# Altium schematic symbol library Minh_Lib.SchLib: 619 symbols (part 2 of 4)
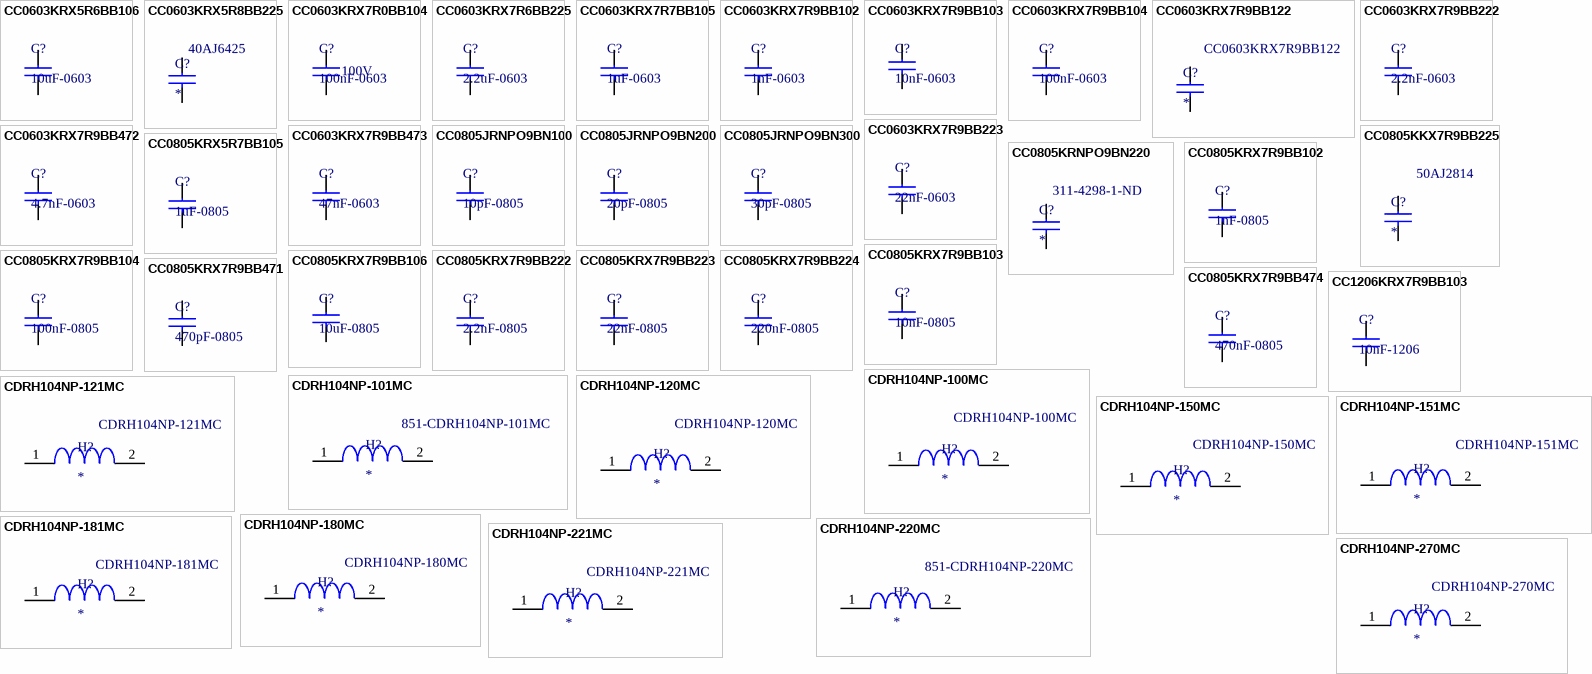
[diagram p16: symbols CC0603KRX5R6BB106 to CDRH104NP-270MC]

## CC0603KRX7R9BB222
designator C?, comment 2.2nF-0603
Multilayer Ceramic Capacitors MLCC - SMD/SMT 2200PF 50V 10% 0603; Manufacturer: Yageo; Manufacturer Part Number: CC0603KRX7R9BB222; Type: General Purpose and High Capacitance Surface Mount Ceramic Multilayer Capacitor; Voltage Rating DC: 50 VDC; Capacitance - nF: 2.2 nF; Capacitance - uF: 0.0022 uF; Class: Class 2; Dielectric: X7R; Value: 2.2nF; Supplier 1: Mouser; RoHS: RoHS Compliant; Category: Multilayer Ceramic Capacitors MLCC - SMD/SMT; Stock 1: 167669; Pricing 1: 1=0.100, 10=0.090, 100=0.070, 1000=0.065, 4000=0.010, 8000=0.009 (USD); Capacitance: 2200 pF; Height: 0.8 mm; Length: 1.6 mm; Package / Case: 0603 (1608 metric); Packaging: Cut Tape; Product: General Type MLCCs; Series: CC; Termination Style: SMD/SMT; Tolerance: 10 %; Brand: Yageo; Case Code - in: 0603; Case Code - mm: 1608; Maximum Operating Temperature: + 125 C; Minimum Operating Temperature: - 55 C; Product Type: Ceramic Capacitors; Standard Pack Qty: 4000; Subcategory: Capacitors; Termination: Standard; RoHS - Mouser: Y; Minimum Order Quantity: 1; Reeling: True; ComponentLink1URL: https://www.mouser.com/datasheet/2/447/UPY-GPHC_X7R_6.3V-to-50V_18-1154002.pdf; ComponentLink1Description: https://www.mouser.com/datasheet/2/447/UPY-GPHC_X7R_6.3V-to-50V_18-1154002.pdf; Supplier Part Number 1: 603-C0603KRX7R9BB222; Width: 0.8 mm
footprint CAP0603 (Capacitor SMD 0603 ( imperal ))
pins: 1, 2

## CC0603KRX7R9BB223
designator C?, comment 22nF-0603
Multilayer Ceramic Capacitors MLCC - SMD/SMT 22nF 50V X7R 10%; Manufacturer: Yageo; Manufacturer Part Number: CC0603KRX7R9BB223; Capacitance: 0.022 uF; Type: General Purpose and High Capacitance Surface Mount Ceramic Multilayer Capacitor; Voltage Rating DC: 50 VDC; Capacitance - pF: 22000 pF; Class: Class 2; Supplier 1: Mouser; RoHS: RoHS Compliant; Category: Multilayer Ceramic Capacitors MLCC - SMD/SMT; Stock 1: 23033; Pricing 1: 1=0.100, 10=0.064, 100=0.020, 1000=0.015, 4000=0.011, 8000=0.010, 24000=0.009 (USD); Height: 0.8 mm; Length: 1.6 mm; Package / Case: 0603 (1608 metric); Packaging: Cut Tape; Product: General Type MLCCs; Series: CC; Termination Style: SMD/SMT; Tolerance: 10 %; Width: 0.8 mm; Brand: Yageo; Capacitance - nF: 22 nF; Case Code - in: 0603; Case Code - mm: 1608; Dielectric: X7R; Maximum Operating Temperature: + 125 C; Minimum Operating Temperature: - 55 C; Product Type: Ceramic Capacitors; Standard Pack Qty: 4000; Subcategory: Capacitors; Termination: Standard; RoHS - Mouser: Y; Minimum Order Quantity: 1; Reeling: True; ComponentLink1URL: https://www.mouser.com/datasheet/2/447/UPY-GPHC_X7R_6.3V-to-50V_18-1154002.pdf; ComponentLink1Description: https://www.mouser.com/datasheet/2/447/UPY-GPHC_X7R_6.3V-to-50V_18-1154002.pdf; Supplier Part Number 1: 603-CC603KRX7R9BB223; Value: 22nF
footprint CAP0603 (Capacitor SMD 0603 ( imperal ))
pins: 1, 2

## CC0603KRX7R9BB472
designator C?, comment 4.7nF-0603
Multilayer Ceramic Capacitors MLCC - SMD/SMT 4700PF 50V 10% 0603; Manufacturer: Yageo; Manufacturer Part Number: CC0603KRX7R9BB472; Type: General Purpose and High Capacitance Surface Mount Ceramic Multilayer Capacitor; Voltage Rating DC: 50 VDC; Capacitance - nF: 4.7 nF; Capacitance - uF: 0.0047 uF; Class: Class 2; Dielectric: X7R; Value: 4.7nF; Supplier 1: Mouser; RoHS: RoHS Compliant; Category: Multilayer Ceramic Capacitors MLCC - SMD/SMT; Stock 1: 246315; Pricing 1: 1=0.100, 10=0.027, 100=0.016, 1000=0.013, 4000=0.009, 8000=0.008, 24000=0.007, 48000=0.006 (USD); Capacitance: 4700 pF; Height: 0.8 mm; Length: 1.6 mm; Package / Case: 0603 (1608 metric); Packaging: Cut Tape; Product: General Type MLCCs; Series: CC; Termination Style: SMD/SMT; Tolerance: 10 %; Width: 0.8 mm; Brand: Yageo; Case Code - in: 0603; Case Code - mm: 1608; Maximum Operating Temperature: + 125 C; Minimum Operating Temperature: - 55 C; Product Type: Ceramic Capacitors; Standard Pack Qty: 4000; Subcategory: Capacitors; Termination: Standard; RoHS - Mouser: Y; Minimum Order Quantity: 1; Reeling: True; Supplier Part Number 1: 603-C0603KRX7R9BB472
footprint CAP0603 (Capacitor SMD 0603 ( imperal ))
pins: 1, 2

## CC0603KRX7R9BB473
designator C?, comment 47nF-0603
CAP CER 0.047UF 50V X7R 0603; Manufacturer: Yageo; Manufacturer Part Number: CC0603KRX7R9BB473; Tolerance: ±10%; Notification: Current market demand for these product types have resulted in fluctuating and extending lead times. Lead times may differ.; Value: 47nF; Supplier 1: Digi-Key; RoHS: RoHS Compliant; Category: Capacitors; Stock 1: 2478; Pricing 1: 1=0.1, 10=0.074, 100=0.0329, 500=0.02352, 1000=0.01848 (USD); Packaging: Cut Tape (CT); Part Status: Active; Voltage - Rated: 50V; Temperature Coefficient: X7R; Operating Temperature: -55°C ~ 125°C; Features: -; Ratings: -; Applications: General Purpose; Failure Rate: -; Mounting Type: Surface Mount, MLCC; Package / Case: 0603 (1608 Metric); Size / Dimension: 0.063" L x 0.032" W (1.60mm x 0.80mm); Height - Seated (Max): -; Thickness (Max): 0.035" (0.90mm); Lead Spacing: -; Lead Style: -; ComponentLink1URL: http://www.yageo.com/documents/recent/UPY-GPHC_X7R_6.3V-to-50V_18.pdf; ComponentLink1Description: http://www.yageo.com/documents/recent/UPY-GPHC_X7R_6.3V-to-50V_18.pdf; Supplier Part Number 1: 311-1427-1-ND
footprint CAP0603 (Capacitor SMD 0603 ( imperal ))
pins: 1, 2

## CC0805JRNPO9BN100
designator C?, comment 10pF-0805
Multilayer Ceramic Capacitors MLCC - SMD/SMT 50V 10pF C0G 0805 5%; Manufacturer: Yageo; Manufacturer Part Number: CC0805JRNPO9BN100; Type: General Purpose Surface-Mount Ceramic Multilayer Capacitor; Voltage Rating DC: 50 VDC; Class: Class 1; Dielectric: C0G (NP0); Supplier 1: Mouser; RoHS: RoHS Compliant; Category: Multilayer Ceramic Capacitors MLCC - SMD/SMT; Stock 1: 39132; Pricing 1: 1=0.120, 10=0.090, 100=0.042, 500=0.029, 1000=0.024, 2000=0.023, 4000=0.021, 8000=0.018 (USD); Capacitance: 10 pF; Height: 0.6 mm; Length: 2 mm; Package / Case: 0805 (2012 metric); Packaging: Cut Tape; Product: General Type MLCCs; Series: CC; Termination Style: SMD/SMT; Tolerance: 5 %; Width: 1.25 mm; Brand: Yageo; Case Code - in: 0805; Case Code - mm: 2012; Maximum Operating Temperature: + 125 C; Minimum Operating Temperature: - 55 C; Product Type: Ceramic Capacitors; Standard Pack Qty: 4000; Subcategory: Capacitors; Termination: Standard; RoHS - Mouser: Y; Minimum Order Quantity: 1; Reeling: True; ComponentLink1URL: https://www.mouser.com/datasheet/2/447/yago_s_a0009251638_1-2286572.pdf; ComponentLink1Description: https://www.mouser.com/datasheet/2/447/yago_s_a0009251638_1-2286572.pdf; Supplier Part Number 1: 603-CC805JRNPO9BN100; Value: 10pF
footprint CAP0805
pins: 1, 2

## CC0805JRNPO9BN200
designator C?, comment 20pF-0805
Multilayer Ceramic Capacitors MLCC - SMD/SMT 20pF 50V NPO 5%; Manufacturer: Yageo; Manufacturer Part Number: CC0805JRNPO9BN200; Type: General Purpose Surface-Mount Ceramic Multilayer Capacitor; Voltage Rating DC: 50 VDC; Class: Class 1; Dielectric: C0G (NP0); Supplier 1: Mouser; RoHS: RoHS Compliant By Exemption; Category: Multilayer Ceramic Capacitors MLCC - SMD/SMT; Stock 1: 0; Pricing 1: 1=0.100, 10=0.040, 100=0.018, 1000=0.014, 4000=0.013 (USD); Capacitance: 20 pF; Length: 2 mm; Package / Case: 0805 (2012 metric); Packaging: Cut Tape; Product: General Type MLCCs; Series: CC; Termination Style: SMD/SMT; Tolerance: 5 %; Width: 1.25 mm; Brand: Yageo; Case Code - in: 0805; Case Code - mm: 2012; Maximum Operating Temperature: + 125 C; Minimum Operating Temperature: - 55 C; Product Type: Ceramic Capacitors; Standard Pack Qty: 4000; Subcategory: Capacitors; Termination: Standard; RoHS - Mouser: E; Minimum Order Quantity: 1; Reeling: True; ComponentLink1URL: http://www.mouser.com/datasheet/2/447/UPY-GP_NP0_16V-to-50V_16-1109089.pdf; ComponentLink1Description: http://www.mouser.com/datasheet/2/447/UPY-GP_NP0_16V-to-50V_16-1109089.pdf; Supplier Part Number 1: 603-CC805JRNPO9BN200
footprint CAP0805
pins: 1, 2

## CC0805JRNPO9BN300
designator C?, comment 30pF-0805
CAP CER 30PF 50V NPO 0805; Manufacturer: Yageo; Manufacturer Part Number: CC0805JRNPO9BN300; Tolerance: ±5%; Temperature Coefficient: C0G, NP0; Notification: Current market demand for these product types have resulted in fluctuating and extending lead times. Lead times may differ.; Supplier 1: Digi-Key; RoHS: RoHS Compliant; Category: Capacitors; Stock 1: 0; Pricing 1: 1=0.15, 10=0.107, 100=0.0503, 500=0.03524, 1000=0.02918 (USD); Packaging: Cut Tape (CT); Part Status: Active; Voltage - Rated: 50V; Operating Temperature: -55°C ~ 125°C; Features: High Voltage; Ratings: -; Applications: General Purpose; Failure Rate: -; Mounting Type: Surface Mount, MLCC; Package / Case: 0805 (2012 Metric); Size / Dimension: 0.079" L x 0.049" W (2.00mm x 1.25mm); Height - Seated (Max): -; Thickness (Max): 0.028" (0.70mm); Lead Spacing: -; Lead Style: -; ComponentLink1URL: http://www.yageo.com/documents/recent/UPY-GP_NP0_16V-to-50V_16.pdf; ComponentLink1Description: http://www.yageo.com/documents/recent/UPY-GP_NP0_16V-to-50V_16.pdf; Supplier Part Number 1: 311-4234-1-ND
footprint CAP0805
pins: 1, 2

## CC0805KKX7R9BB225
designator C?  Supplier Part Number 1: 50AJ2814
0805 50 V 2.2 uF ±10% Tolerance X7R Multilayer Ceramic Capacitor; Manufacturer: Yageo; Manufacturer Part Number: CC0805KKX7R9BB225; Capacitance: 2.2uF; Voltage Rating: 50V; Supplier 1: Newark; RoHS: Yes; Category: Ceramic Capacitors; Stock 1: 21000; Pricing 1: 1=0.09000, 3000=0.08700, 6000=0.08300, 12000=0.07800, 18000=0.07700, 30000=0.07600 (USD); Mount: Surface Mount; Case/Package: 0805; Case Code (Imperial): 0805; Case Code (Metric): 2012; Weight: 0.000194oz; Min Operating Temperature: -55°C; Max Operating Temperature: 125°C; Packaging: Tape and Reel; Tolerance: 10%; Dielectric: X7R; Termination: SMD/SMT; Voltage Rating (DC): 50V; Package Quantity: 3000; Length: 0.079inch; Width: 0.049inch; Thickness: 0.057inch; Lead Free: Lead Free; Halogen Free: Halogen Free; RoHS Compliant: Yes; ComponentLink1URL: http://www.mouser.com/ds/2/447/Yageo_UPY-GP_NP0_16V-to-50V_9-358835.pdf?src-supplier=Mouser; ComponentLink1Description: http://www.mouser.com/ds/2/447/Yageo_UPY-GP_NP0_16V-to-50V_9-358835.pdf?src-supplier=Mouser; ComponentLink2URL: http://www.yageo.com/documents/recent/UPY-GPHC_X7R_6.3V-to-50V_18.pdf?src-supplier=Digi-Key; ComponentLink2Description: http://www.yageo.com/documents/recent/UPY-GPHC_X7R_6.3V-to-50V_18.pdf?src-supplier=Digi-Key; ComponentLink3URL: http://www.yageo.com/documents/recent/UPY-GPHC_X7R_6.3V-to-50V_16.pdf?src-supplier=Digi-Key; ComponentLink3Description: http://www.yageo.com/documents/recent/UPY-GPHC_X7R_6.3V-to-50V_16.pdf?src-supplier=Digi-Key
footprint CAP0805
pins: 1, 2

## CC0805KRNPO9BN220
designator C?  Supplier Part Number 1: 311-4298-1-ND
CAP CER 22PF 50V NPO 0805; Manufacturer: Yageo; Manufacturer Part Number: CC0805KRNPO9BN220; Tolerance: 10%; Dielectric: C0G; Supplier 1: Digi-Key; RoHS: Yes; Category: Ceramic Capacitors; Stock 1: 24186; Pricing 1: 1=0.11000, 10=0.08100, 50=0.04580, 100=0.03800, 500=0.02662, 1000=0.02203 (USD); Mount: Surface Mount; Case/Package: 0805; Case Code (Imperial): 0805; Case Code (Metric): 2012; Weight: 0.000194oz; Min Operating Temperature: -55°C; Max Operating Temperature: 125°C; Capacitance: 22pF; Packaging: Tape and Reel; Voltage Rating (DC): 50V; Voltage Rating: 50V; Termination: SMD/SMT; Resistor Type: Ceramic; Series: CC; Length: 0.079inch; Width: 0.049inch; Thickness: 0.028inch; RoHS Compliant: Yes; ComponentLink1URL: https://datasheet.ciiva.com/13264/upy-gp-np0-16v-to-50v-8-3714-13264558.pdf?src-supplier=Mouser; ComponentLink1Description: https://datasheet.ciiva.com/13264/upy-gp-np0-16v-to-50v-8-3714-13264558.pdf?src-supplier=Mouser
footprint CAP0805
pins: 1, 2

## CC0805KRX5R7BB105
designator C?, comment 1uF-0805
CAP CER 1UF 16V X5R 0805; Manufacturer: Yageo; Manufacturer Part Number: CC0805KRX5R7BB105; Tolerance: ±10%; Notification: Current market demand for these product types have resulted in fluctuating and extending lead times. Lead times may differ.; Supplier 1: Digi-Key; RoHS: RoHS Compliant; Category: Capacitors; Stock 1: 0; Pricing 1: 4000=0.0422 (USD); Packaging: Tape & Reel (TR); Part Status: Active; Voltage - Rated: 16V; Temperature Coefficient: X5R; Operating Temperature: -55°C ~ 85°C; Features: -; Ratings: -; Applications: General Purpose; Failure Rate: -; Mounting Type: Surface Mount, MLCC; Package / Case: 0805 (2012 Metric); Size / Dimension: 0.079" L x 0.049" W (2.00mm x 1.25mm); Height - Seated (Max): -; Thickness (Max): 0.057" (1.45mm); Lead Spacing: -; Lead Style: -; ComponentLink1URL: http://www.yageo.com/documents/recent/UPY-GPHC_X5R_4V-to-50V_25.pdf; ComponentLink1Description: http://www.yageo.com/documents/recent/UPY-GPHC_X5R_4V-to-50V_25.pdf; Supplier Part Number 1: 311-3427-2-ND
footprint CAP0805
pins: 1, 2

## CC0805KRX7R9BB102
designator C?, comment 1nF-0805
Multilayer Ceramic Capacitors MLCC - SMD/SMT 50V 1000pF X7R 0805 10%; Manufacturer: Yageo; Manufacturer Part Number: CC0805KRX7R9BB102; Type: General Purpose and High Capacitance Surface Mount Ceramic Multilayer Capacitor; Voltage Rating DC: 50 VDC; Capacitance - nF: 1 nF; Capacitance - uF: 0.001 uF; Class: Class 2; Value: 1nF; Supplier 1: Mouser; RoHS: RoHS Compliant; Category: Multilayer Ceramic Capacitors MLCC - SMD/SMT; Stock 1: 0; Pricing 1: 1=0.140, 10=0.088, 100=0.039, 500=0.028, 1000=0.022, 2000=0.020, 4000=0.018, 8000=0.016 (USD); Capacitance: 1000 pF; Height: 0.6 mm; Length: 2 mm; Package / Case: 0805 (2012 metric); Packaging: Cut Tape; Product: General Type MLCCs; Series: CC; Termination Style: SMD/SMT; Tolerance: 10 %; Width: 1.25 mm; Brand: Yageo; Case Code - in: 0805; Case Code - mm: 2012; Dielectric: X7R; Maximum Operating Temperature: + 125 C; Minimum Operating Temperature: - 55 C; Product Type: Ceramic Capacitors; Standard Pack Qty: 4000; Subcategory: Capacitors; Termination: Standard; RoHS - Mouser: Y; Minimum Order Quantity: 1; Reeling: True; ComponentLink1URL: https://www.mouser.com/datasheet/2/447/UPY_GPHC_X7R_6_3V_to_50V_20-1995650.pdf; ComponentLink1Description: https://www.mouser.com/datasheet/2/447/UPY_GPHC_X7R_6_3V_to_50V_20-1995650.pdf; Supplier Part Number 1: 603-CC805KRX7R9BB102
footprint CAP0805
pins: 1, 2

## CC0805KRX7R9BB103
designator C?, comment 10nF-0805
CAP CER 10000PF 50V X7R 0805; Manufacturer: Yageo; Manufacturer Part Number: CC0805KRX7R9BB103; Tolerance: ±10%; Notification: Current market demand for these product types have resulted in fluctuating and extending lead times. Lead times may differ.; Supplier 1: Digi-Key; RoHS: RoHS Compliant; Category: Capacitors; Stock 1: 0; Pricing 1: 1=0.13, 10=0.094, 100=0.0418, 500=0.02984, 1000=0.02345 (USD); Packaging: Cut Tape (CT); Part Status: Active; Voltage - Rated: 50V; Temperature Coefficient: X7R; Operating Temperature: -55°C ~ 125°C; Features: High Voltage; Ratings: -; Applications: General Purpose; Failure Rate: -; Mounting Type: Surface Mount, MLCC; Package / Case: 0805 (2012 Metric); Size / Dimension: 0.079" L x 0.049" W (2.00mm x 1.25mm); Height - Seated (Max): -; Thickness (Max): 0.024" (0.60mm); Lead Spacing: -; Lead Style: -; ComponentLink1URL: http://www.yageo.com/documents/recent/UPY-GPHC_X7R_6.3V-to-50V_18.pdf; ComponentLink1Description: http://www.yageo.com/documents/recent/UPY-GPHC_X7R_6.3V-to-50V_18.pdf; Supplier Part Number 1: 311-1136-1-ND
footprint CAP0805
footprint CAP0805
pins: 1, 2

## CC0805KRX7R9BB104
designator C?, comment 100nF-0805
CAP CER 0.1UF 50V X7R 0805; Manufacturer: Yageo; Manufacturer Part Number: CC0805KRX7R9BB104; Tolerance: ±10%; Notification: Current market demand for these product types have resulted in fluctuating and extending lead times. Lead times may differ.; Supplier 1: Digi-Key; RoHS: RoHS Compliant; Category: Capacitors; Stock 1: 0; Pricing 1: 1=0.13, 10=0.093, 100=0.0439, 500=0.03076, 1000=0.02547 (USD); Packaging: Cut Tape (CT); Part Status: Active; Voltage - Rated: 50V; Temperature Coefficient: X7R; Operating Temperature: -55°C ~ 125°C; Features: High Voltage; Ratings: -; Applications: General Purpose; Failure Rate: -; Mounting Type: Surface Mount, MLCC; Package / Case: 0805 (2012 Metric); Size / Dimension: 0.079" L x 0.049" W (2.00mm x 1.25mm); Height - Seated (Max): -; Thickness (Max): 0.033" (0.85mm); Lead Spacing: -; Lead Style: -; ComponentLink1URL: http://www.yageo.com/documents/recent/UPY-GPHC_X7R_6.3V-to-50V_18.pdf; ComponentLink1Description: http://www.yageo.com/documents/recent/UPY-GPHC_X7R_6.3V-to-50V_18.pdf; Supplier Part Number 1: 311-1140-1-ND
footprint CAP0805
pins: 1, 2

## CC0805KRX7R9BB106
designator C?, comment 10uF-0805
CAP CER 10uF-0805
footprint CAP0805
pins: 1, 2

## CC0805KRX7R9BB222
designator C?, comment 2.2nF-0805
Multilayer Ceramic Capacitors MLCC - SMD/SMT 50V 2200pF X7R 0805 10%; Manufacturer: Yageo; Manufacturer Part Number: CC0805KRX7R9BB222; Type: General Purpose and High Capacitance Surface Mount Ceramic Multilayer Capacitor; Voltage Rating DC: 50 VDC; Capacitance - nF: 2.2 nF; Capacitance - uF: 0.0022 uF; Class: Class 2; Value: 2.2nF; Supplier 1: Mouser; RoHS: RoHS Compliant; Category: Multilayer Ceramic Capacitors MLCC - SMD/SMT; Stock 1: 0; Pricing 1: 1=0.110, 10=0.081, 100=0.038, 500=0.027, 1000=0.022, 4000=0.018, 8000=0.017 (USD); Capacitance: 2200 pF; Height: 0.6 mm; Length: 2 mm; Package / Case: 0805 (2012 metric); Packaging: Cut Tape; Product: General Type MLCCs; Series: CC; Termination Style: SMD/SMT; Tolerance: 10 %; Width: 1.25 mm; Brand: Yageo; Case Code - in: 0805; Case Code - mm: 2012; Dielectric: X7R; Maximum Operating Temperature: + 125 C; Minimum Operating Temperature: - 55 C; Product Type: Ceramic Capacitors; Standard Pack Qty: 4000; Subcategory: Capacitors; Termination: Standard; RoHS - Mouser: Y; Minimum Order Quantity: 1; Reeling: True; ComponentLink1URL: https://www.mouser.com/datasheet/2/447/UPY_GPHC_X7R_6_3V_to_50V_20-1995650.pdf; ComponentLink1Description: https://www.mouser.com/datasheet/2/447/UPY_GPHC_X7R_6_3V_to_50V_20-1995650.pdf; Supplier Part Number 1: 603-CC805KRX7R9BB222
footprint CAP0805
pins: 1, 2

## CC0805KRX7R9BB223
designator C?, comment 22nF-0805
Multilayer Ceramic Capacitors MLCC - SMD/SMT 22nF 50V X7R 10%; Manufacturer: Yageo; Manufacturer Part Number: CC0805KRX7R9BB223; Capacitance: 0.022 uF; Type: General Purpose and High Capacitance Surface Mount Ceramic Multilayer Capacitor; Voltage Rating DC: 50 VDC; Capacitance - pF: 22000 pF; Class: Class 2; Supplier 1: Mouser; RoHS: RoHS Compliant; Category: Multilayer Ceramic Capacitors MLCC - SMD/SMT; Stock 1: 0; Pricing 1: 1=0.110, 10=0.061, 100=0.027, 1000=0.023, 4000=0.017, 8000=0.016, 24000=0.015, 48000=0.014, 100000=0.011 (USD); Height: 0.6 mm; Length: 2 mm; Package / Case: 0805 (2012 metric); Packaging: Cut Tape; Product: General Type MLCCs; Series: CC; Termination Style: SMD/SMT; Tolerance: 10 %; Width: 1.25 mm; Brand: Yageo; Capacitance - nF: 22 nF; Case Code - in: 0805; Case Code - mm: 2012; Dielectric: X7R; Maximum Operating Temperature: + 125 C; Minimum Operating Temperature: - 55 C; Product Type: Ceramic Capacitors; Standard Pack Qty: 4000; Subcategory: Capacitors; Termination: Standard; RoHS - Mouser: Y; Minimum Order Quantity: 1; Reeling: True; ComponentLink1URL: https://www.mouser.com/datasheet/2/447/UPY-GPHC_X7R_6.3V-to-50V_18-1154002.pdf; ComponentLink1Description: https://www.mouser.com/datasheet/2/447/UPY-GPHC_X7R_6.3V-to-50V_18-1154002.pdf; Supplier Part Number 1: 603-CC805KRX7R9BB223; Value: 22nF
footprint CAP0805
pins: 1, 2

## CC0805KRX7R9BB224
designator C?, comment 220nF-0805
Multilayer Ceramic Capacitors MLCC - SMD/SMT 220nF 50V X7R 10%; Manufacturer: Yageo; Manufacturer Part Number: CC0805KRX7R9BB224; Capacitance: 0.22 uF; Type: General Purpose and High Capacitance Surface Mount Ceramic Multilayer Capacitor; Voltage Rating DC: 50 VDC; Capacitance - pF: 220000 pF; Class: Class 2; Product Status: Obsolete; Supplier 1: Mouser; Category: Multilayer Ceramic Capacitors MLCC - SMD/SMT; Stock 1: 0; Height: 1.25 mm; Length: 2 mm; Package / Case: 0805 (2012 metric); Packaging: Cut Tape; Product: General Type MLCCs; Series: CC; Termination Style: SMD/SMT; Tolerance: 10 %; Width: 1.25 mm; Brand: Yageo; Capacitance - nF: 220 nF; Case Code - in: 0805; Case Code - mm: 2012; Dielectric: X7R; Maximum Operating Temperature: + 125 C; Minimum Operating Temperature: - 55 C; Product Type: Ceramic Capacitors; Standard Pack Qty: 4000; Subcategory: Capacitors; Termination: Standard; Minimum Order Quantity: 1; Reeling: True; ComponentLink1URL: https://www.mouser.com/datasheet/2/447/UPY-GPHC_X7R_6.3V-to-50V_18-1154002.pdf; ComponentLink1Description: https://www.mouser.com/datasheet/2/447/UPY-GPHC_X7R_6.3V-to-50V_18-1154002.pdf; Supplier Part Number 1: 603-CC805KRX7R9BB224; Value: 220nF
footprint CAP0805
pins: 1, 2

## CC0805KRX7R9BB471
designator C?, comment 470pF-0805
YAGEO - CC0805KRX7R9BB471 - SMD Multilayer Ceramic Capacitor, 470 pF, 50 V, 0805 [2012 Metric], ± 10%, X7R, CC Series - SMD Multilayer Ceramic Capacitor, 470 pF, 50 V, 0805 [2012 Metric], ± 10%, X7R, CC Series; Capacitance: 470pF; Voltage Rating: 50V; Insulation Resistance: 100GR; Value: 470pF; Supplier 1: Digi-Key; Supplier Part Number 1: 311-1124-1-ND; Manufacturer: Yageo; Manufacturer Part Number: CC0805KRX7R9BB471; RoHS: Yes; Category: Ceramic Capacitors; Stock 1: 184905; Pricing 1: 1=0.11000, 10=0.07700, 50=0.04340, 100=0.03600, 500=0.02522, 1000=0.02089 (USD); Mount: Surface Mount; Case/Package: 0805; Number of Pins: 2; Case Code (Imperial): 0805; Case Code (Metric): 2012; Material: Ceramic; Dielectric Material: Ceramic; Min Operating Temperature: -55°C; Max Operating Temperature: 125°C; Tolerance: 10%; Dielectric: X7R; Package Quantity: 1; Voltage Rating (DC): 50V; Packaging: Tape and Reel; Termination: SMD/SMT; Resistor Type: Ceramic; Series: CC; Construction: Flat; Length: 2mm; Width: 1.25mm; Height: 0.6mm; Depth: 1.25mm; Thickness: 0.024inch; Radiation Hardening: No; REACH SVHC: Unknown; Lead Free: Lead Free; Halogen Free: Halogen Free; RoHS Compliant: Yes; ComponentLink1URL: https://datasheet.ciiva.com/29148/445173-da-01-en-kerko-chip-0805-x7r-470pf-10proz-50vg-29148961.pdf?src-supplier=Conrad; ComponentLink1Description: https://datasheet.ciiva.com/29148/445173-da-01-en-kerko-chip-0805-x7r-470pf-10proz-50vg-29148961.pdf?src-supplier=Conrad; ComponentLink2URL: https://datasheet.ciiva.com/144/mlccorderingcode-144598.pdf?src-supplier=Digi-Key; ComponentLink2Description: https://datasheet.ciiva.com/144/mlccorderingcode-144598.pdf?src-supplier=Digi-Key; ComponentLink3URL: https://datasheet.ciiva.com/144/mlccorderingcode-144599.pdf?src-supplier=Digi-Key; ComponentLink3Description: https://datasheet.ciiva.com/144/mlccorderingcode-144599.pdf?src-supplier=Digi-Key; ComponentLink4URL: https://datasheet.ciiva.com/144/mlccorderingcode-144600.pdf?src-supplier=Digi-Key; ComponentLink4Description: https://datasheet.ciiva.com/144/mlccorderingcode-144600.pdf?src-supplier=Digi-Key; ComponentLink5URL: https://datasheet.ciiva.com/46396/1489800-46396332.pdf?src-supplier=Element14; ComponentLink5Description: https://datasheet.ciiva.com/46396/1489800-46396332.pdf?src-supplier=Element14; ComponentLink6URL: https://datasheet.ciiva.com/15189/getdatasheetpartid-299872-15189229.pdf?src-supplier=Verical; ComponentLink6Description: https://datasheet.ciiva.com/15189/getdatasheetpartid-299872-15189229.pdf?src-supplier=Verical
footprint CAP0805
pins: 1, 2

## CC0805KRX7R9BB474
designator C?, comment 470nF-0805
Multilayer Ceramic Capacitors MLCC - SMD/SMT; Manufacturer: Yageo; Manufacturer Part Number: CC0805KRX7R9BB474; Capacitance: 0.47 uF; Tolerance: 10 %; Type: General Purpose and High Capacitance Surface Mount Ceramic Multilayer Capacitor; Voltage Rating DC: 50 VDC; Capacitance - nF: 470 nF; Capacitance - pF: 470000 pF; Class: Class 2; Dielectric: X7R; Value: 470nF; Supplier 1: Mouser; Category: Multilayer Ceramic Capacitors MLCC - SMD/SMT; Stock 1: 0; Height: 1.25 mm; Length: 2 mm; Package / Case: 0805 (2012 metric); Product: General Type MLCCs; Series: CC; Termination Style: SMD/SMT; Width: 1.25 mm; Brand: Yageo; Case Code - in: 0805; Case Code - mm: 2012; Maximum Operating Temperature: + 125 C; Minimum Operating Temperature: - 55 C; Product Type: Ceramic Capacitors; Subcategory: Capacitors; Termination: Standard; Minimum Order Quantity: 1; Reeling: False; ComponentLink1URL: https://www.mouser.com/datasheet/2/447/UPY-GPHC_X7R_6.3V-to-50V_18-1154002.pdf; ComponentLink1Description: https://www.mouser.com/datasheet/2/447/UPY-GPHC_X7R_6.3V-to-50V_18-1154002.pdf; Supplier Part Number 1: N/A
footprint CAP0805
pins: 1, 2

## CC1206KRX7R9BB103
designator C?, comment 10nF-1206
Multilayer Ceramic Capacitors MLCC - SMD/SMT 50V 0.01uF X7R 1206 10%; Manufacturer: Yageo; Manufacturer Part Number: CC1206KRX7R9BB103; Type: General Purpose and High Capacitance Surface Mount Ceramic Multilayer Capacitor; Voltage Rating DC: 50 VDC; Capacitance - nF: 10 nF; Capacitance - pF: 10000 pF; Class: Class 2; Value: 10nF; Supplier 1: Mouser; RoHS: RoHS Compliant; Category: Multilayer Ceramic Capacitors MLCC - SMD/SMT; Stock 1: 18986; Pricing 1: 1=0.260, 10=0.171, 100=0.086, 500=0.064, 1000=0.055, 4000=0.045, 8000=0.043 (USD); Capacitance: 0.01 uF; Height: 0.85 mm; Length: 3.2 mm; Package / Case: 1206 (3216 metric); Packaging: Cut Tape; Product: General Type MLCCs; Series: CC; Termination Style: SMD/SMT; Tolerance: 10 %; Width: 1.6 mm; Brand: Yageo; Case Code - in: 1206; Case Code - mm: 3216; Dielectric: X7R; Maximum Operating Temperature: + 125 C; Minimum Operating Temperature: - 55 C; Product Type: Ceramic Capacitors; Standard Pack Qty: 4000; Subcategory: Capacitors; Termination: Standard; RoHS - Mouser: Y; Minimum Order Quantity: 1; Reeling: True; Supplier Part Number 1: 603-CC206KRX7R9BB103
footprint CAP1206
pins: 1, 2

## CDRH104NP-100MC
designator H?  Supplier Part Number 1: CDRH104NP-100MC
Ind Power Shielded Wirewound 10uH 20% 1KHz 2.4A Carrier T/R; Manufacturer: Sumida; DC Resistance (DCR): 50mR; Supplier 1: Avnet; Manufacturer Part Number: CDRH104NP-100MC; RoHS: Yes; Category: Fixed Inductors; Pricing 1: 1000=0.53250, 2000=0.52500, 4000=0.51000, 6000=0.49875, 8000=0.48000, 10000=0.46875, 100000=0.34648 (USD); Mount: Surface Mount; Case/Package: Nonstandard; Min Operating Temperature: -40°C; Max Operating Temperature: 100°C; Packaging: Tape and Reel; Tolerance: 20%; Package Quantity: 1000; Shielding: Shielded; Current Rating: 2.4A; Inductance: 10uH; Test Frequency: 1kHz; Max DC Current: 2.4A; Termination: SMD/SMT; Series: CDRH104; Length: 0.386inch; Width: 0.35inch; Height: 5mm; Height - Seated (Max): 0.197inch; Depth: 9.2mm; Radiation Hardening: No; RoHS Compliant: Yes; ComponentLink1URL: https://datasheet.ciiva.com/8499/cdc4d20-8499040.pdf?src-supplier=Avnet; ComponentLink1Description: https://datasheet.ciiva.com/8499/cdc4d20-8499040.pdf?src-supplier=Avnet
footprint CDRH104NP (Inductor)
pins: 1, 2

## CDRH104NP-101MC
designator H?  Supplier Part Number 1: 851-CDRH104NP-101MC
Ind Power Shielded Wirewound 100uH 20% 1KHz 760mA Carrier T/R; Manufacturer: Sumida; Manufacturer Part Number: CDRH104NP-101MC; DC Resistance (DCR): 410mR; Supplier 1: Mouser; RoHS: Yes; Category: Fixed Inductors; Stock 1: 959; Pricing 1: 1=1.31000, 10=1.27000, 50=1.27000, 100=0.92600, 1000=0.60100, 10000=0.57000 (USD); Mount: Surface Mount; Case/Package: Nonstandard; Min Operating Temperature: -40°C; Max Operating Temperature: 100°C; Packaging: Tape and Reel; Tolerance: 20%; Current Rating: 760mA; Shielding: Shielded; Inductance: 100uH; Test Frequency: 1kHz; Max DC Current: 760mA; Termination: SMD/SMT; Series: CDRH104; Length: 0.386inch; Width: 0.35inch; Height: 5mm; Height - Seated (Max): 0.197inch; Depth: 9.2mm; Radiation Hardening: No; RoHS Compliant: Yes; ComponentLink1URL: http://www.mouser.com/ds/2/390/CDRH104-523471.pdf?src-supplier=Mouser; ComponentLink1Description: http://www.mouser.com/ds/2/390/CDRH104-523471.pdf?src-supplier=Mouser; ComponentLink2URL: http://products.sumida.com/products/pdf/CDRH104.pdf?src-supplier=Digi-Key; ComponentLink2Description: http://products.sumida.com/products/pdf/CDRH104.pdf?src-supplier=Digi-Key; ComponentLink3URL: http://www.sumida.com/products/pdf/CDRH104.pdf?src-supplier=Avnet; ComponentLink3Description: http://www.sumida.com/products/pdf/CDRH104.pdf?src-supplier=Avnet
footprint CDRH104NP (Inductor)
pins: 1, 2

## CDRH104NP-120MC
designator H?  Supplier Part Number 1: CDRH104NP-120MC
Ind Power Shielded Wirewound 12uH 20% 1KHz 2.25A Carrier T/R; Manufacturer: Sumida; DC Resistance (DCR): 54mR; Supplier 1: Avnet; Manufacturer Part Number: CDRH104NP-120MC; RoHS: Yes; Category: Fixed Inductors; Pricing 1: 1000=0.53250, 2000=0.52500, 4000=0.51000, 6000=0.49875, 8000=0.48000, 10000=0.46875, 100000=0.34648 (USD); Mount: Surface Mount; Case/Package: Nonstandard; Min Operating Temperature: -40°C; Max Operating Temperature: 100°C; Packaging: Tape and Reel; Tolerance: 20%; Package Quantity: 1000; Current Rating: 2.25A; Shielding: Shielded; Inductance: 12uH; Test Frequency: 1kHz; Max DC Current: 2.25A; Termination: SMD/SMT; Series: CDRH104; Length: 0.386inch; Width: 0.35inch; Height: 5mm; Height - Seated (Max): 0.197inch; Depth: 9.2mm; Radiation Hardening: No; RoHS Compliant: Yes; ComponentLink1URL: http://www.sumida.com/products/pdf/CDRH104.pdf?src-supplier=Avnet; ComponentLink1Description: http://www.sumida.com/products/pdf/CDRH104.pdf?src-supplier=Avnet; ComponentLink2URL: http://products.sumida.com/products/pdf/CDRH104.pdf?src-supplier=Digi-Key; ComponentLink2Description: http://products.sumida.com/products/pdf/CDRH104.pdf?src-supplier=Digi-Key; ComponentLink3URL: http://www.sumida.com/products/pdf/CDRH104.pdf?src-supplier=Mouser; ComponentLink3Description: http://www.sumida.com/products/pdf/CDRH104.pdf?src-supplier=Mouser
footprint CDRH104NP (Inductor)
pins: 1, 2

## CDRH104NP-121MC
designator H?  Supplier Part Number 1: CDRH104NP-121MC
Ind Power Shielded Wirewound 120uH 20% 1KHz 700mA Carrier T/R; Manufacturer: Sumida; DC Resistance (DCR): 450mR; Supplier 1: Avnet; Manufacturer Part Number: CDRH104NP-121MC; RoHS: Yes; Category: Fixed Inductors; Pricing 1: 1000=0.53250, 2000=0.52500, 4000=0.51000, 6000=0.49875, 8000=0.48000, 10000=0.46875, 100000=0.34648 (USD); Mount: Surface Mount; Case/Package: Nonstandard; Min Operating Temperature: -40°C; Max Operating Temperature: 100°C; Package Quantity: 1000; Packaging: Tape and Reel; Tolerance: 20%; Shielding: Shielded; Current Rating: 700mA; Inductance: 120uH; Max DC Current: 700mA; Termination: SMD/SMT; Test Frequency: 1kHz; Series: CDRH104; Length: 0.386inch; Width: 9.2mm; Height: 5mm; Height - Seated (Max): 0.197inch; Depth: 9.2mm; Radiation Hardening: No; RoHS Compliant: Yes; ComponentLink1URL: https://datasheet.ciiva.com/13317/cdrh104-218837-13317456.pdf?src-supplier=Mouser; ComponentLink1Description: https://datasheet.ciiva.com/13317/cdrh104-218837-13317456.pdf?src-supplier=Mouser
footprint CDRH104NP (Inductor)
pins: 1, 2

## CDRH104NP-150MC
designator H?  Supplier Part Number 1: CDRH104NP-150MC
Ind Power Shielded Wirewound 15uH 20% 1KHz 2A Carrier T/R; Manufacturer: Sumida; DC Resistance (DCR): 61mR; Supplier 1: Avnet; Manufacturer Part Number: CDRH104NP-150MC; RoHS: Yes; Category: Fixed Inductors; Pricing 1: 1000=0.53250, 2000=0.52500, 4000=0.51000, 6000=0.49875, 8000=0.48000, 10000=0.46875, 100000=0.34648 (USD); Mount: Surface Mount; Case/Package: Nonstandard; Min Operating Temperature: -40°C; Max Operating Temperature: 100°C; Packaging: Tape and Reel; Tolerance: 20%; Current Rating: 2A; Shielding: Shielded; Inductance: 15uH; Test Frequency: 1kHz; Max DC Current: 2A; Termination: SMD/SMT; Series: CDRH104; Length: 0.386inch; Width: 0.35inch; Height: 5mm; Height - Seated (Max): 0.197inch; Depth: 9.2mm; Radiation Hardening: No; RoHS Compliant: Yes; ComponentLink1URL: http://www.mouser.com/ds/2/390/CDRH104-523471.pdf?src-supplier=Mouser; ComponentLink1Description: http://www.mouser.com/ds/2/390/CDRH104-523471.pdf?src-supplier=Mouser; ComponentLink2URL: http://www.sumida.com/products/pdf/CDRH104.pdf?src-supplier=Avnet; ComponentLink2Description: http://www.sumida.com/products/pdf/CDRH104.pdf?src-supplier=Avnet; ComponentLink3URL: http://products.sumida.com/products/pdf/CDRH104.pdf?src-supplier=Digi-Key; ComponentLink3Description: http://products.sumida.com/products/pdf/CDRH104.pdf?src-supplier=Digi-Key
footprint CDRH104NP (Inductor)
pins: 1, 2

## CDRH104NP-151MC
designator H?  Supplier Part Number 1: CDRH104NP-151MC
Inductor Power Shielded Wirewound 150uH 20% 1KHz 0.63A 0.64Ohm DCR T/R; Manufacturer: Sumida; Current Rating: 630mA; DC Resistance (DCR): 640mR; Supplier 1: Arrow Electronics; Manufacturer Part Number: CDRH104NP-151MC; RoHS: Yes; Category: Fixed Inductors; Stock 1: 4000; Pricing 1: 1000=0.46880 (USD); Mount: Surface Mount; Case/Package: Nonstandard; Min Operating Temperature: -40°C; Max Operating Temperature: 100°C; Packaging: Tape and Reel; Tolerance: 20%; Shielding: Shielded; Inductance: 150uH; Max DC Current: 630mA; Termination: SMD/SMT; Test Frequency: 1kHz; Series: CDRH104; Length: 0.386inch; Width: 9.2mm; Height: 5mm; Height - Seated (Max): 0.197inch; Depth: 9.2mm; Radiation Hardening: No; RoHS Compliant: Yes; ComponentLink1URL: http://www.mouser.com/ds/2/390/CDRH104-523471.pdf?src-supplier=Mouser; ComponentLink1Description: http://www.mouser.com/ds/2/390/CDRH104-523471.pdf?src-supplier=Mouser; ComponentLink2URL: http://www.sumida.com/products/pdf/CDRH104.pdf?src-supplier=Avnet; ComponentLink2Description: http://www.sumida.com/products/pdf/CDRH104.pdf?src-supplier=Avnet; ComponentLink3URL: http://products.sumida.com/products/pdf/CDRH104.pdf?src-supplier=Digi-Key; ComponentLink3Description: http://products.sumida.com/products/pdf/CDRH104.pdf?src-supplier=Digi-Key
footprint CDRH104NP (Inductor)
pins: 1, 2

## CDRH104NP-180MC
designator H?  Supplier Part Number 1: CDRH104NP-180MC
Ind Power Shielded Wirewound 18uH 20% 1KHz 1.8A Carrier T/R; Manufacturer: Sumida; DC Resistance (DCR): 84mR; Supplier 1: Avnet; Manufacturer Part Number: CDRH104NP-180MC; RoHS: Yes; Category: Fixed Inductors; Pricing 1: 1000=0.53250, 2000=0.52500, 4000=0.51000, 6000=0.49875, 8000=0.48000, 10000=0.46875, 100000=0.34648 (USD); Mount: Surface Mount; Case/Package: Nonstandard; Min Operating Temperature: -40°C; Max Operating Temperature: 100°C; Current Rating: 1.8A; Shielding: Shielded; Packaging: Tape and Reel; Tolerance: 20%; Package Quantity: 1000; Inductance: 18uH; Max DC Current: 1.8A; Termination: SMD/SMT; Test Frequency: 1kHz; Series: CDRH104; Length: 0.386inch; Width: 9.2mm; Height: 5mm; Height - Seated (Max): 0.197inch; Depth: 9.2mm; Radiation Hardening: No; RoHS Compliant: Yes; ComponentLink1URL: http://www.sumida.com/products/pdf/CDRH104.pdf?src-supplier=Avnet; ComponentLink1Description: http://www.sumida.com/products/pdf/CDRH104.pdf?src-supplier=Avnet; ComponentLink2URL: http://www.sumida.com/products/pdf/CDRH104.pdf?src-supplier=Mouser; ComponentLink2Description: http://www.sumida.com/products/pdf/CDRH104.pdf?src-supplier=Mouser; ComponentLink3URL: http://products.sumida.com/products/pdf/CDRH104.pdf?src-supplier=Digi-Key; ComponentLink3Description: http://products.sumida.com/products/pdf/CDRH104.pdf?src-supplier=Digi-Key
footprint CDRH104NP (Inductor)
pins: 1, 2

## CDRH104NP-181MC
designator H?  Supplier Part Number 1: CDRH104NP-181MC
Ind Power Shielded Wirewound 180uH 20% 1KHz 570mA Carrier T/R; Manufacturer: Sumida; DC Resistance (DCR): 840mR; Supplier 1: Avnet; Manufacturer Part Number: CDRH104NP-181MC; RoHS: Yes; Category: Fixed Inductors; Pricing 1: 1000=0.53250, 2000=0.52500, 4000=0.51000, 6000=0.49875, 8000=0.48000, 10000=0.46875, 100000=0.34648 (USD); Mount: Surface Mount; Case/Package: Nonstandard; Min Operating Temperature: -40°C; Max Operating Temperature: 100°C; Package Quantity: 1000; Packaging: Tape and Reel; Tolerance: 20%; Shielding: Shielded; Current Rating: 570mA; Inductance: 180uH; Max DC Current: 570mA; Termination: SMD/SMT; Test Frequency: 1kHz; Series: CDRH104; Length: 0.386inch; Width: 9.2mm; Height: 5mm; Height - Seated (Max): 0.197inch; Depth: 9.2mm; Radiation Hardening: No; RoHS Compliant: Yes; ComponentLink1URL: http://www.mouser.com/ds/2/390/CDRH104-523471.pdf?src-supplier=Mouser; ComponentLink1Description: http://www.mouser.com/ds/2/390/CDRH104-523471.pdf?src-supplier=Mouser; ComponentLink2URL: http://www.sumida.com/products/pdf/CDRH104.pdf?src-supplier=Avnet; ComponentLink2Description: http://www.sumida.com/products/pdf/CDRH104.pdf?src-supplier=Avnet; ComponentLink3URL: http://products.sumida.com/products/pdf/CDRH104.pdf?src-supplier=Digi-Key; ComponentLink3Description: http://products.sumida.com/products/pdf/CDRH104.pdf?src-supplier=Digi-Key
footprint CDRH104NP (Inductor)
pins: 1, 2

## CDRH104NP-220MC
designator H?  Supplier Part Number 1: 851-CDRH104NP-220MC
Ind Power Shielded Wirewound 22uH 20% 1KHz 1.65A Carrier T/R; Manufacturer: Sumida; Manufacturer Part Number: CDRH104NP-220MC; DC Resistance (DCR): 94mR; Supplier 1: Mouser; RoHS: Yes; Category: Fixed Inductors; Stock 1: 639; Pricing 1: 1=1.31000, 10=1.27000, 50=1.27000, 100=0.92600, 1000=0.62900, 10000=0.59300 (USD); Mount: Surface Mount; Case/Package: Nonstandard; Min Operating Temperature: -40°C; Max Operating Temperature: 100°C; Package Quantity: 1000; Packaging: Tape and Reel; Tolerance: 20%; Shielding: Shielded; Current Rating: 1.65A; Inductance: 22uH; Max DC Current: 1.65A; Termination: SMD/SMT; Test Frequency: 1kHz; Series: CDRH104; Length: 0.386inch; Width: 9.2mm; Height: 5mm; Height - Seated (Max): 0.197inch; Depth: 9.2mm; Radiation Hardening: No; RoHS Compliant: Yes; ComponentLink1URL: http://www.mouser.com/ds/2/390/CDRH104-523471.pdf?src-supplier=Mouser; ComponentLink1Description: http://www.mouser.com/ds/2/390/CDRH104-523471.pdf?src-supplier=Mouser; ComponentLink2URL: http://products.sumida.com/products/pdf/CDRH104.pdf?src-supplier=Digi-Key; ComponentLink2Description: http://products.sumida.com/products/pdf/CDRH104.pdf?src-supplier=Digi-Key; ComponentLink3URL: http://www.sumida.com/products/pdf/CDRH104.pdf?src-supplier=Avnet; ComponentLink3Description: http://www.sumida.com/products/pdf/CDRH104.pdf?src-supplier=Avnet
footprint CDRH104NP (Inductor)
pins: 1, 2
